# Altium footprint library Elements_LT.PcbLib: 145 footprints (part 8 of 10)
Each footprint in its own frame and in the unit in brackets; x right, y up, seen from the top. Pads: shape width x height; smd on the part's side, far side on the other; paste and mask are expansions set on the pad; w line width, h text height; cw(c..) or ccw(c..) is an arc to the next point about the centre after c.
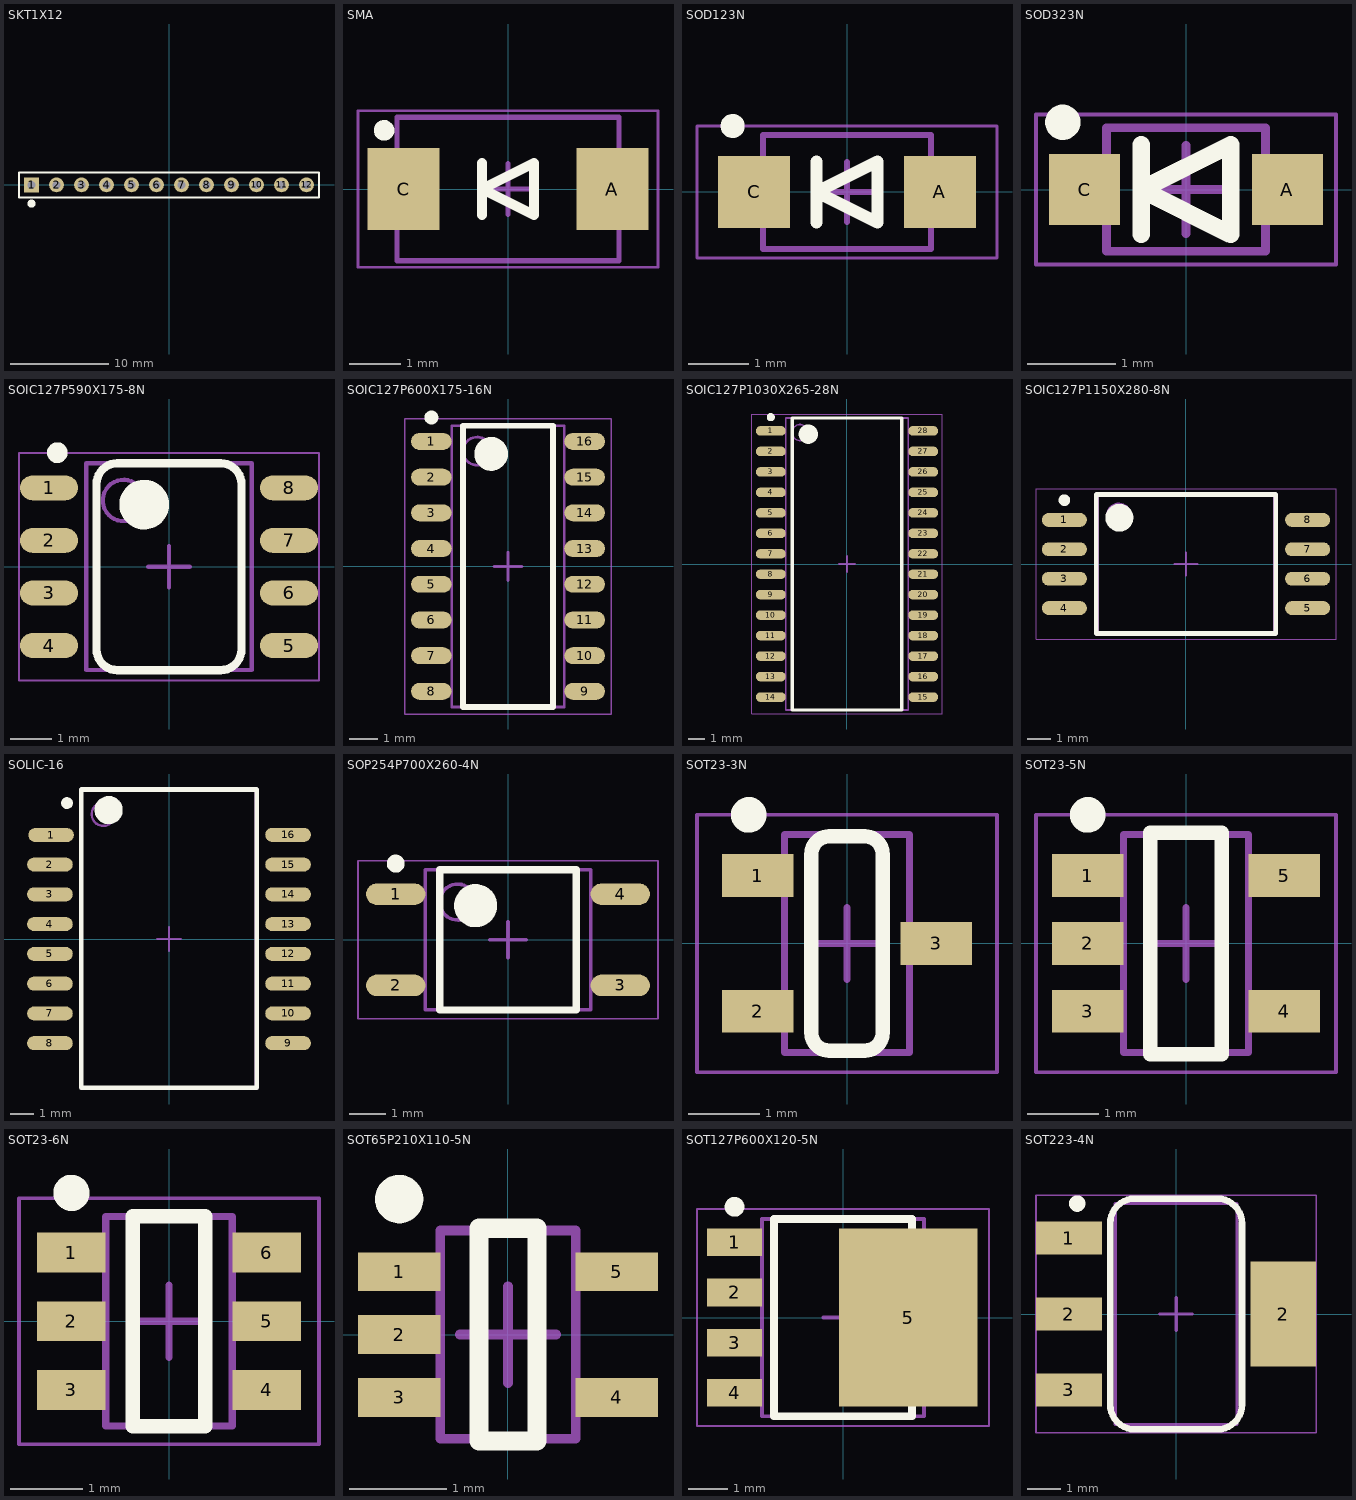
[diagram p7: the footprints below, top view; thin cyan lines are the x and y axes]

## SKT1X12 [mm] "Connector; Socket; 12 Position"
pads (12):
  rect 1.5x1.5 hole 0.8: 1(-13.97,0)
  round 1.5 hole 0.8: 2(-11.43,0) 3(-8.89,0) 4(-6.35,0) 5(-3.81,0) 6(-1.27,0) 7(1.27,0) 8(3.81,0) 9(6.35,0) 10(8.89,0) 11(11.43,0) 12(13.97,0)
Top Overlay:
  circle w0.406: c-13.97,-1.905 r0.203
  lines w0.2: -15.24,-1.27 15.24,-1.27 15.24,1.27 -15.24,1.27 -15.24,-1.27
3D body "socket1.step": height 7, standoff -3.1, extent 12.7,-1.25 15.199,1.25
3D body "socket1.step": height 7, standoff -3.1, extent 10.16,-1.25 12.659,1.25
3D body "socket1.step": height 7, standoff -3.1, extent 7.62,-1.25 10.119,1.25
3D body "socket1.step": height 7, standoff -3.1, extent 5.08,-1.25 7.579,1.25
3D body "socket1.step": height 7, standoff -3.1, extent -15.24,-1.25 -12.74,1.25
3D body "socket1.step": height 7, standoff -3.1, extent -12.7,-1.25 -10.2,1.25
3D body "socket1.step": height 7, standoff -3.1, extent -10.16,-1.25 -7.661,1.25
3D body "socket1.step": height 7, standoff -3.1, extent -7.62,-1.25 -5.121,1.25
3D body "socket1.step": height 7, standoff -3.1, extent -5.08,-1.25 -2.581,1.25
3D body "socket1.step": height 7, standoff -3.1, extent -2.54,-1.25 -0.041,1.25
3D body "socket1.step": height 7, standoff -3.1, extent 0,-1.25 2.499,1.25
3D body "socket1.step": height 7, standoff -3.1, extent 2.54,-1.25 5.039,1.25

## SMA [mm] "Diode, 2.9x4.8mm, SMT"
height 2.4
pads (2):
  rect 1.4x1.6 smd: A(2.032,0) C(-2.032,0)
Top Overlay:
  circle w0.2: c-2.413,1.143 r0.1
  lines w0.2: -0.508,-0.508 -0.508,0.508 ; -0.508,0 0.508,-0.508 0.508,0.508 -0.508,0
Mechanical 13:
  lines w0.1: -2.159,-1.397 -2.159,1.397 2.159,1.397 2.159,-1.397 -2.159,-1.397
Mechanical 15:
  lines w0.05: -2.921,-1.524 -2.921,1.524 2.921,1.524 2.921,-1.524 -2.921,-1.524
  lines w0.1: -0.5,0 0.5,0 ; 0,-0.5 0,0.5
3D body: height 1.1, standoff 0, extent -2.159,-1.397 2.159,1.397

## SOD123N [mm] "Diode, 1.70x3.50mm, SMT"
height 1.1
pads (2):
  rect 1.2x1.2 smd: A(1.55,0) C(-1.55,0)
Top Overlay:
  circle w0.2: c-1.905,1.1 r0.1
  lines w0.2: -0.508,-0.508 -0.508,0.508 ; -0.508,0 0.508,0.508 0.508,-0.508 -0.508,0
Mechanical 13:
  lines w0.1: -1.4,-0.95 1.4,-0.95 1.4,0.95 -1.4,0.95 -1.4,-0.95
Mechanical 15:
  lines w0.05: -2.5,-1.1 2.5,-1.1 2.5,1.1 -2.5,1.1 -2.5,-1.1
  lines w0.1: -0.5,0 0.5,0 ; 0,-0.5 0,0.5
3D body "DO-215AD.stp": height 1.35, standoff 0, extent -1.95,-0.85 1.9,0.85

## SOD323N [mm] "Diode, 1.8x1.4mm, SMT"
height 1.1
pads (2):
  rect 0.8x0.8 smd: A(1.15,0) C(-1.15,0)
Top Overlay:
  circle w0.2: c-1.397,0.762 r0.1
  lines w0.2: -0.508,-0.508 -0.508,0.508 ; -0.508,0 0.508,-0.508 0.508,0.508 -0.508,0
Mechanical 13:
  lines w0.1: -0.9,-0.7 -0.9,0.7 0.9,0.7 0.9,-0.7 -0.9,-0.7
Mechanical 15:
  lines w0.05: -1.7,-0.85 -1.7,0.85 1.7,0.85 1.7,-0.85 -1.7,-0.85
  lines w0.1: -0.5,0 0.5,0 ; 0,-0.5 0,0.5
3D body "SC-76.stp": height 1.1, standoff 0, extent -1.35,-0.725 1.35,0.725

## SOIC127P590X175-8N [mm] "SOIC, 8-Leads, Body 4.90x3.90mm, Pitch 1.27mm, IPC Medium Density"
height 1.75
pads (8):
  oval 1.4x0.6 smd: 1(-2.9,1.905) 2(-2.9,0.635) 3(-2.9,-0.635) 4(-2.9,-1.905) 5(2.9,-1.905) 6(2.9,-0.635) 7(2.9,0.635) 8(2.9,1.905)
Top Overlay:
  circle w0.6: c-0.6,1.5 r0.3
  circle w0.25: c-2.7,2.755 r0.125
  lines w0.2: -1.75,-2 ccw(c-1.25,-2) -1.25,-2.5 1.25,-2.5 ccw(c1.25,-2) 1.75,-2 1.75,2 ccw(c1.25,2) 1.25,2.5 -1.25,2.5 ccw(c-1.25,2) -1.75,2 -1.75,-2
Mechanical 13:
  circle w0.1: c-1.1,1.6 r0.5
  lines w0.1: -2,-2.5 2,-2.5 2,2.5 -2,2.5 -2,-2.5
Mechanical 15:
  lines w0.05: -3.625,-2.75 3.625,-2.75 3.625,2.75 -3.625,2.75 -3.625,-2.75
  lines w0.1: -0.5,0 0.5,0 ; 0,-0.5 0,0.5
3D body "MS-012AA.stp": height 1.75, standoff 0, extent -3.125,-2.5 3.075,2.5

## SOIC127P600X175-16N [mm] "SOIC, 16-Leads, Body 9.90x3.90mm, Pitch 1.27mm, IPC Medium Density"
height 1.75
pads (16):
  oval 1.45x0.6 smd: 1(-2.725,4.445) 2(-2.725,3.175) 3(-2.725,1.905) 4(-2.725,0.635) 5(-2.725,-0.635) 6(-2.725,-1.905) 7(-2.725,-3.175) 8(-2.725,-4.445) 9(2.725,-4.445) 10(2.725,-3.175) 11(2.725,-1.905) 12(2.725,-0.635) 13(2.725,0.635) 14(2.725,1.905) 15(2.725,3.175) 16(2.725,4.445)
Top Overlay:
  circle w0.6: c-0.6,4 r0.3
  circle w0.25: c-2.725,5.295 r0.125
  lines w0.2: -1.6,-5 1.6,-5 1.6,5 -1.6,5 -1.6,-5
Mechanical 13:
  circle w0.1: c-1.1,4.1 r0.5
  lines w0.1: -2,-5 2,-5 2,5 -2,5 -2,-5
Mechanical 15:
  lines w0.05: -3.675,-5.25 3.675,-5.25 3.675,5.25 -3.675,5.25 -3.675,-5.25
  lines w0.1: -0.5,0 0.5,0 ; 0,-0.5 0,0.5
3D body: height 1.75, standoff 0.1, extent -2,-5 2,5

## SOIC127P1030X265-28N [mm] "SOIC, 28-Leads, Body 17.90x7.50mm, Pitch 1.27mm, IPC Medium Density"
height 2.65
pads (28):
  oval 1.85x0.6 smd: 1(-4.725,8.255) 2(-4.725,6.985) 3(-4.725,5.715) 4(-4.725,4.445) 5(-4.725,3.175) 6(-4.725,1.905) 7(-4.725,0.635) 8(-4.725,-0.635) 9(-4.725,-1.905) 10(-4.725,-3.175) 11(-4.725,-4.445) 12(-4.725,-5.715) 13(-4.725,-6.985) 14(-4.725,-8.255) 15(4.725,-8.255) 16(4.725,-6.985) 17(4.725,-5.715) 18(4.725,-4.445) 19(4.725,-3.175) 20(4.725,-1.905) 21(4.725,-0.635) 22(4.725,0.635) 23(4.725,1.905) 24(4.725,3.175) 25(4.725,4.445) 26(4.725,5.715) 27(4.725,6.985) 28(4.725,8.255)
Top Overlay:
  circle w0.6: c-2.4,8.05 r0.3
  circle w0.25: c-4.725,9.105 r0.125
  lines w0.2: -3.4,-9.05 3.4,-9.05 3.4,9.05 -3.4,9.05 -3.4,-9.05
Mechanical 13:
  circle w0.1: c-2.9,8.15 r0.5
  lines w0.1: -3.8,-9.05 3.8,-9.05 3.8,9.05 -3.8,9.05 -3.8,-9.05
Mechanical 15:
  lines w0.05: -5.9,-9.3 5.9,-9.3 5.9,9.3 -5.9,9.3 -5.9,-9.3
  lines w0.1: -0.5,0 0.5,0 ; 0,-0.5 0,0.5
3D body: height 2.65, standoff 0.1, extent -3.8,-9.05 3.8,9.05

## SOIC127P1150X280-8N [mm] "SOIC, 8-Leads, Wide Body 5.85x7.50mm, Pitch 1.27mm, IPC Medium Density"
height 2.8
pads (8):
  oval 1.95x0.6 smd: 1(-5.25,1.905) 2(-5.25,0.635) 3(-5.25,-0.635) 4(-5.25,-1.905) 5(5.25,-1.905) 6(5.25,-0.635) 7(5.25,0.635) 8(5.25,1.905)
Top Overlay:
  circle w0.6: c-2.875,2 r0.3
  circle w0.25: c-5.25,2.755 r0.125
  lines w0.2: -3.875,-3 3.875,-3 3.875,3 -3.875,3 -3.875,-3
Mechanical 13:
  circle w0.1: c-2.9,2.1 r0.5
  lines w0.1: -3.8,-3 3.8,-3 3.8,3 -3.8,3 -3.8,-3
Mechanical 15:
  lines w0.05: -6.475,-3.25 6.475,-3.25 6.475,3.25 -6.475,3.25 -6.475,-3.25
  lines w0.1: -0.5,0 0.5,0 ; 0,-0.5 0,0.5
3D body "SOIC127P1150X280-8N.step": height 2.8, standoff 0, extent -5.75,-3 5.75,3

## SOLIC-16 [mm] "SOIC, 16-Leads, Body 9.90x3.90mm, Pitch 1.27mm, IPC Medium Density"
height 1.75
pads (16):
  oval 1.95x0.6 smd: 1(-5.03,4.435) 2(-5.08,3.175) 3(-5.08,1.905) 4(-5.08,0.635) 5(-5.08,-0.635) 6(-5.08,-1.905) 7(-5.08,-3.175) 8(-5.08,-4.445) 9(5.08,-4.445) 10(5.08,-3.175) 11(5.08,-1.905) 12(5.08,-0.635) 13(5.08,0.635) 14(5.08,1.905) 15(5.08,3.175) 16(5.08,4.445)
Top Overlay:
  circle w0.25: c-4.35,5.8 r0.125
  circle w0.6: c-2.575,5.5 r0.3
  lines w0.2: -3.75,-6.35 -3.75,6.375 3.75,6.375 3.75,-6.35 -3.75,-6.35
Mechanical 13:
  circle w0.1: c-2.8,5.325 r0.5
  lines w0.1: -3.75,-6.4 -3.75,6.4 3.75,6.4 3.75,-6.4 -3.75,-6.4
Mechanical 15:
  lines w0.05: -3.675,-6.375 -3.675,6.35 3.675,6.35 3.675,-6.375 -3.675,-6.375
  lines w0.1: -0.5,0 0.5,0 ; 0,-0.5 0,0.5
3D body: height 1.75, standoff 0.1, extent -3.725,-6.375 3.725,6.375

## SOP254P700X260-4N [mm] "SOP, 4-Leads, Body 3.60x4.40mm, Pitch 2.54mm, IPC Medium Density"
height 2.6
pads (4):
  oval 1.65x0.6 smd: 1(-3.125,1.27) 2(-3.125,-1.27) 3(3.125,-1.27) 4(3.125,1.27)
Top Overlay:
  circle w0.25: c-3.125,2.12 r0.125
  circle w0.6: c-0.9,0.95 r0.3
  lines w0.2: -1.9,-1.95 -1.9,1.95 1.9,1.95 1.9,-1.95 -1.9,-1.95
Mechanical 13:
  circle w0.1: c-1.4,1.05 r0.5
  lines w0.1: -2.3,-1.95 -2.3,1.95 2.3,1.95 2.3,-1.95 -2.3,-1.95
Mechanical 15:
  lines w0.05: -4.175,-2.2 -4.175,2.2 4.175,2.2 4.175,-2.2 -4.175,-2.2
  lines w0.1: -0.5,0 0.5,0 ; 0,-0.5 0,0.5
3D body: height 2.6, standoff 0.1, extent -2.3,-1.95 2.3,1.95

## SOT23-3N [mm] "SOT23, 3-Leads, Body 2,90x2,80mm, Pitch 0,95mm, IPC Medium Density"
height 1.45
pads (3):
  rect 1x0.6 smd: 1(-1.25,0.95) 2(-1.25,-0.95) 3(1.25,0)
Top Overlay:
  circle w0.25: c-1.375,1.8 r0.125
  lines w0.2: -0.5,-1.25 ccw(c-0.25,-1.25) -0.25,-1.5 0.25,-1.5 ccw(c0.25,-1.25) 0.5,-1.25 0.5,1.25 ccw(c0.25,1.25) 0.25,1.5 -0.25,1.5 ccw(c-0.25,1.25) -0.5,1.25 -0.5,-1.25
Mechanical 13:
  lines w0.1: -0.875,-1.525 -0.875,1.525 0.875,1.525 0.875,-1.525 -0.875,-1.525
Mechanical 15:
  lines w0.05: -2.1,-1.8 -2.1,1.8 2.1,1.8 2.1,-1.8 -2.1,-1.8
  lines w0.1: -0.5,0 0.5,0 ; 0,-0.5 0,0.5
3D body "2SD0601A.stp": height 1.15, standoff -0.03, extent -1.38,-1.45 1.38,1.45

## SOT23-5N [mm] "SOT23, 5-Leads, Body 2,90x2,80mm, Pitch 0,95mm, IPC Medium Density"
height 1.45
pads (5):
  rect 1x0.6 smd: 1(-1.375,0.95) 2(-1.375,0) 3(-1.375,-0.95) 4(1.375,-0.95) 5(1.375,0.95)
Top Overlay:
  circle w0.25: c-1.375,1.8 r0.125
  lines w0.2: -0.5,-1.55 -0.5,1.55 0.5,1.55 0.5,-1.55 -0.5,-1.55
Mechanical 13:
  lines w0.1: -0.875,-1.525 0.875,-1.525 0.875,1.525 -0.875,1.525 -0.875,-1.525
Mechanical 15:
  lines w0.05: -2.1,-1.8 2.1,-1.8 2.1,1.8 -2.1,1.8 -2.1,-1.8
  lines w0.1: -0.5,0 0.5,0 ; 0,-0.5 0,0.5
3D body "MO-193AB.stp": height 1.1, standoff 0, extent -1.5,-1.5 1.5,1.5

## SOT23-6N [mm] "SOT23, 6-Leads, Body 2,90x2,80mm, Pitch 0,95mm, IPC Medium Density"
height 1.45
pads (6):
  rect 0.95x0.55 smd: 1(-1.35,0.95) 2(-1.35,0) 3(-1.35,-0.95) 4(1.35,-0.95) 5(1.35,0) 6(1.35,0.95)
Top Overlay:
  circle w0.25: c-1.35,1.775 r0.125
  lines w0.2: -0.5,-1.45 -0.5,1.45 0.5,1.45 0.5,-1.45 -0.5,-1.45
Mechanical 13:
  lines w0.1: -0.875,-1.45 0.875,-1.45 0.875,1.45 -0.875,1.45 -0.875,-1.45
Mechanical 15:
  lines w0.05: -2.075,-1.7 2.075,-1.7 2.075,1.7 -2.075,1.7 -2.075,-1.7
  lines w0.1: -0.5,0 0.5,0 ; 0,-0.5 0,0.5
3D body "MO-193AA.stp": height 1.1, standoff 0, extent -1.5,-1.5 1.5,1.5

## SOT65P210X110-5N [mm] "SC70, 5-Leads, Body 2.00x2.10mm, Pitch 0.65mm, IPC Medium Density"
height 1.1
pads (5):
  rect 0.85x0.4 smd: 1(-1.125,0.65) 2(-1.125,0) 3(-1.125,-0.65) 4(1.125,-0.65) 5(1.125,0.65)
Top Overlay:
  circle w0.25: c-1.125,1.4 r0.125
  lines w0.2: -0.3,-1.1 -0.3,1.1 0.3,1.1 0.3,-1.1 -0.3,-1.1
Mechanical 13:
  lines w0.1: -0.7,-1.075 0.7,-1.075 0.7,1.075 -0.7,1.075 -0.7,-1.075
Mechanical 15:
  lines w0.1: -0.5,0 0.5,0 ; 0,-0.5 0,0.5
3D body "SOT65P210X110-5N.step": height 1.1, standoff 0, extent -1.2,-1.075 1.2,1.075

## SOT127P600X120-5N [mm] "SOT669, Power Device, 5-Leads, Body 4.90x6.00mm, Pitch 1.27mm, IPC Medium Density"
height 1.2
pads (5):
  rect 1.4x0.7 smd: 1(-2.75,1.905) 2(-2.75,0.635) 3(-2.75,-0.635) 4(-2.75,-1.905)
  rect 3.5x4.5 smd: 5(1.65,0)
Top Overlay:
  circle w0.25: c-2.75,2.805 r0.125
  lines w0.2: -1.75,-2.5 -1.75,2.5 1.75,2.5 1.75,-2.5 -1.75,-2.5
Mechanical 13:
  lines w0.1: -2.05,-2.5 -2.05,2.5 2.05,2.5 2.05,-2.5 -2.05,-2.5
Mechanical 15:
  lines w0.05: -3.7,-2.75 -3.7,2.75 3.7,2.75 3.7,-2.75 -3.7,-2.75
  lines w0.1: -0.5,0 0.5,0 ; 0,-0.5 0,0.5
3D body "SOT127P600X120-5N.step": height 1.2, standoff 0, extent -3,-2.5 3,2.5

## SOT223-4N [mm] "SOT223, 4-Leads, Body 6,50x7,00mm (avg), Pitch 2,30mm, IPC Medium Density"
height 1.8
pads (4):
  rect 2x1 smd: 1(-3.25,2.3) 2(-3.25,0) 3(-3.25,-2.3)
  rect 2x3.2 smd: 2(3.25,0)
Top Overlay:
  circle w0.25: c-3,3.35 r0.125
  lines w0.2: -2,-2.75 ccw(c-1.25,-2.75) -1.25,-3.5 1.25,-3.5 ccw(c1.25,-2.75) 2,-2.75 2,2.75 ccw(c1.25,2.75) 1.25,3.5 -1.25,3.5 ccw(c-1.25,2.75) -2,2.75 -2,0 -2,-2.75
Mechanical 13:
  lines w0.1: -1.85,-3.35 1.85,-3.35 1.85,3.35 -1.85,3.35 -1.85,-3.35
Mechanical 15:
  lines w0.05: -4.25,-3.6 4.25,-3.6 4.25,3.6 -4.25,3.6 -4.25,-3.6
  lines w0.1: -0.5,0 0.5,0 ; 0,-0.5 0,0.5
3D body "TO-261AA.stp": height 1.8, standoff 0, extent -3.65,-3.325 3.65,3.375